# Altium integrated library Samtec 2 mm Pitch Terminal Strips.IntLib: 623 symbols (part 1 of 5) (continued)
## MMT-107-01-L-DH-K
designator P?
Horizontal Surface Mount Header, -55 to 125 degC, 2 mm Pitch, 14-Pin, Male, RoHS; Manufacturer: Samtec; PartNumber: MMT-107-01-L-DH-K; Pitch: 2 mm; DatasheetVersion: F-214; PackageVersion: CY, 12/2000; PackageReference: MMT-107-01-X-DH-K; PackageDescription: 2mm Horizontal Terminal Surface Mount Strip ASSEM; Orientation: Horizontal; RoHS: True; Temperature Range: -55 to 125 degC; Mounting Technology: Surface Mount; ComponentLink1Description: Manufacturer URL; ComponentLink1URL: http://www.samtec.com; ComponentLink2Description: Datasheet; ComponentLink2URL: http://d2a072wq521u33.cloudfront.net/catalog_english//MMT_SM.PDF; ComponentLink3Description: Package Specification; ComponentLink3URL: http://www.samtec.com/documents/webfiles/cpdf/MMT-1XX-XX-XX-XX-XX-XXX-X-XX-MKT.pdf
footprint SMTC-MMT-107-01-X-DH-K (Terminal Surface Mount Strip ASSEM, 2x7 Pins, Horizontal, 2mm Pitch, Male)
pins: 1, 2, 3, 4, 5, 6, 7, 8, 9, 10, 11, 12, 13, 14

## MMT-107-01-L-MT
designator P?
Header, Horizontal, -55 to 125 degC, 2 mm Pitch, 14-Pin, Male, RoHS; Manufacturer: Samtec; PartNumber: MMT-107-01-L-MT; Pitch: 2 mm; DatasheetVersion: F-214; PackageVersion: CY, 12/2000; PackageReference: MMT-107-01-X-MT; PackageDescription: 2mm Horizontal Terminal Surface Mount Strip ASSEM; Supplier 1: Newark; Supplier Part Number 1: 85T5699; Orientation: Horizontal; RoHS: True; Temperature Range: -55 to 125 degC; ComponentLink1Description: Manufacturer URL; ComponentLink1URL: http://www.samtec.com; ComponentLink2Description: Datasheet; ComponentLink2URL: http://d2a072wq521u33.cloudfront.net/catalog_english//MMT_SM.PDF; ComponentLink3Description: Package Specification; ComponentLink3URL: http://www.samtec.com/documents/webfiles/cpdf/MMT-1XX-XX-XX-XX-XX-XXX-X-XX-MKT.pdf
footprint SMTC-MMT-107-01-X-MT (Terminal Strip ASSEM, 2x7 Pins, Horizontal, 2mm Pitch, Male)
pins: 1, 2, 3, 4, 5, 6, 7, 8, 9, 10, 11, 12, 13, 14

## MMT-107-01-L-SH
designator P?
Horizontal Surface Mount Header, -55 to 125 degC, 2 mm Pitch, 7-Pin, Male, RoHS; Manufacturer: Samtec; PartNumber: MMT-107-01-L-SH; Pitch: 2 mm; DatasheetVersion: F-214; PackageVersion: CY, 12/2000; PackageReference: MMT-107-01-X-SH; PackageDescription: 2mm Horizontal Terminal Surface Mount Strip ASSEM; Supplier 1: Newark; Supplier Part Number 1: 85T5700; Orientation: Horizontal; RoHS: True; Temperature Range: -55 to 125 degC; Mounting Technology: Surface Mount; ComponentLink1Description: Manufacturer URL; ComponentLink1URL: http://www.samtec.com; ComponentLink2Description: Datasheet; ComponentLink2URL: http://d2a072wq521u33.cloudfront.net/catalog_english//MMT_SM.PDF; ComponentLink3Description: Package Specification; ComponentLink3URL: http://www.samtec.com/documents/webfiles/cpdf/MMT-1XX-XX-XX-XX-XX-XXX-X-XX-MKT.pdf
footprint SMTC-MMT-107-01-X-SH (Terminal Surface Mount Strip ASSEM, 1x7 Pins, Horizontal, 2mm Pitch, Male)
pins: 1, 2, 3, 4, 5, 6, 7

## MMT-107-01-T-DH-K
designator P?
Horizontal Surface Mount Header, -55 to 105 degC, 2 mm Pitch, 14-Pin, Male, RoHS; Manufacturer: Samtec; PartNumber: MMT-107-01-T-DH-K; Pitch: 2 mm; DatasheetVersion: F-214; PackageVersion: CY, 12/2000; PackageReference: MMT-107-01-X-DH-K; PackageDescription: 2mm Horizontal Terminal Surface Mount Strip ASSEM; Orientation: Horizontal; RoHS: True; Temperature Range: -55 to 105 degC; Mounting Technology: Surface Mount; ComponentLink1Description: Manufacturer URL; ComponentLink1URL: http://www.samtec.com; ComponentLink2Description: Datasheet; ComponentLink2URL: http://d2a072wq521u33.cloudfront.net/catalog_english//MMT_SM.PDF; ComponentLink3Description: Package Specification; ComponentLink3URL: http://www.samtec.com/documents/webfiles/cpdf/MMT-1XX-XX-XX-XX-XX-XXX-X-XX-MKT.pdf
footprint SMTC-MMT-107-01-X-DH-K (Terminal Surface Mount Strip ASSEM, 2x7 Pins, Horizontal, 2mm Pitch, Male)
pins: 1, 2, 3, 4, 5, 6, 7, 8, 9, 10, 11, 12, 13, 14

## MMT-107-01-T-MT
designator P?
Header, Horizontal, -55 to 105 degC, 2 mm Pitch, 14-Pin, Male, RoHS; Manufacturer: Samtec; PartNumber: MMT-107-01-T-MT; Pitch: 2 mm; DatasheetVersion: F-214; PackageVersion: CY, 12/2000; PackageReference: MMT-107-01-X-MT; PackageDescription: 2mm Horizontal Terminal Surface Mount Strip ASSEM; Supplier 1: Newark; Supplier Part Number 1: 85T5702; Orientation: Horizontal; RoHS: True; Temperature Range: -55 to 105 degC; ComponentLink1Description: Manufacturer URL; ComponentLink1URL: http://www.samtec.com; ComponentLink2Description: Datasheet; ComponentLink2URL: http://d2a072wq521u33.cloudfront.net/catalog_english//MMT_SM.PDF; ComponentLink3Description: Package Specification; ComponentLink3URL: http://www.samtec.com/documents/webfiles/cpdf/MMT-1XX-XX-XX-XX-XX-XXX-X-XX-MKT.pdf
footprint SMTC-MMT-107-01-X-MT (Terminal Strip ASSEM, 2x7 Pins, Horizontal, 2mm Pitch, Male)
pins: 1, 2, 3, 4, 5, 6, 7, 8, 9, 10, 11, 12, 13, 14

## MMT-107-01-T-SH
designator P?
Horizontal Surface Mount Header, -55 to 105 degC, 2 mm Pitch, 7-Pin, Male, RoHS; Manufacturer: Samtec; PartNumber: MMT-107-01-T-SH; Pitch: 2 mm; DatasheetVersion: F-214; PackageVersion: CY, 12/2000; PackageReference: MMT-107-01-X-SH; PackageDescription: 2mm Horizontal Terminal Surface Mount Strip ASSEM; Supplier 1: Newark; Supplier Part Number 1: 85T5703; Orientation: Horizontal; RoHS: True; Temperature Range: -55 to 105 degC; Mounting Technology: Surface Mount; ComponentLink1Description: Manufacturer URL; ComponentLink1URL: http://www.samtec.com; ComponentLink2Description: Datasheet; ComponentLink2URL: http://d2a072wq521u33.cloudfront.net/catalog_english//MMT_SM.PDF; ComponentLink3Description: Package Specification; ComponentLink3URL: http://www.samtec.com/documents/webfiles/cpdf/MMT-1XX-XX-XX-XX-XX-XXX-X-XX-MKT.pdf
footprint SMTC-MMT-107-01-X-SH (Terminal Surface Mount Strip ASSEM, 1x7 Pins, Horizontal, 2mm Pitch, Male)
pins: 1, 2, 3, 4, 5, 6, 7

## MMT-108-01-F-DV
designator P?
Surface Mount Header, Vertical, -55 to 125 degC, 2 mm Pitch, 16-Pin, Male, RoHS; Manufacturer: Samtec; PartNumber: MMT-108-01-F-DV; Pitch: 2 mm; DatasheetVersion: F-214; PackageVersion: U, 6/1992; PackageReference: MMT-108-01-X-DV; PackageDescription: 2 mm Terminal SV/DV; Orientation: Vertical; RoHS: True; Temperature Range: -55 to 125 degC; Mounting Technology: Surface Mount; ComponentLink1Description: Manufacturer URL; ComponentLink1URL: http://www.samtec.com; ComponentLink2Description: Datasheet; ComponentLink2URL: http://d2a072wq521u33.cloudfront.net/catalog_english//MMT_SM.PDF; ComponentLink3Description: Package Specification; ComponentLink3URL: http://www.samtec.com/documents/webfiles/cpdf/MMT-1XX-XX-X-XV-XX-XX-XX-MKT.pdf
footprint SMTC-MMT-108-01-X-DV (Terminal SV/DV, 2x8 Pins, Vertical, 2mm Pitch, Male)
pins: 1, 2, 3, 4, 5, 6, 7, 8, 9, 10, 11, 12, 13, 14, 15, 16

## MMT-108-01-F-MT
designator P?
Header, Horizontal, -55 to 125 degC, 2 mm Pitch, 16-Pin, Male, RoHS; Manufacturer: Samtec; PartNumber: MMT-108-01-F-MT; Pitch: 2 mm; DatasheetVersion: F-214; PackageVersion: CY, 12/2000; PackageReference: MMT-108-01-X-MT; PackageDescription: 2mm Horizontal Terminal Surface Mount Strip ASSEM; Orientation: Horizontal; RoHS: True; Temperature Range: -55 to 125 degC; ComponentLink1Description: Manufacturer URL; ComponentLink1URL: http://www.samtec.com; ComponentLink2Description: Datasheet; ComponentLink2URL: http://d2a072wq521u33.cloudfront.net/catalog_english//MMT_SM.PDF; ComponentLink3Description: Package Specification; ComponentLink3URL: http://www.samtec.com/documents/webfiles/cpdf/MMT-1XX-XX-XX-XX-XX-XXX-X-XX-MKT.pdf
footprint SMTC-MMT-108-01-X-MT (Terminal Strip ASSEM, 2x8 Pins, Horizontal, 2mm Pitch, Male)
pins: 1, 2, 3, 4, 5, 6, 7, 8, 9, 10, 11, 12, 13, 14, 15, 16

## MMT-108-01-L-DV
designator P?
Surface Mount Header, Vertical, -55 to 125 degC, 2 mm Pitch, 16-Pin, Male, RoHS; Manufacturer: Samtec; PartNumber: MMT-108-01-L-DV; Pitch: 2 mm; DatasheetVersion: F-214; PackageVersion: U, 6/1992; PackageReference: MMT-108-01-X-DV; PackageDescription: 2 mm Terminal SV/DV; Orientation: Vertical; RoHS: True; Temperature Range: -55 to 125 degC; Mounting Technology: Surface Mount; ComponentLink1Description: Manufacturer URL; ComponentLink1URL: http://www.samtec.com; ComponentLink2Description: Datasheet; ComponentLink2URL: http://d2a072wq521u33.cloudfront.net/catalog_english//MMT_SM.PDF; ComponentLink3Description: Package Specification; ComponentLink3URL: http://www.samtec.com/documents/webfiles/cpdf/MMT-1XX-XX-X-XV-XX-XX-XX-MKT.pdf
footprint SMTC-MMT-108-01-X-DV (Terminal SV/DV, 2x8 Pins, Vertical, 2mm Pitch, Male)
pins: 1, 2, 3, 4, 5, 6, 7, 8, 9, 10, 11, 12, 13, 14, 15, 16

## MMT-108-01-L-MT
designator P?
Header, Horizontal, -55 to 125 degC, 2 mm Pitch, 16-Pin, Male, RoHS; Manufacturer: Samtec; PartNumber: MMT-108-01-L-MT; Pitch: 2 mm; DatasheetVersion: F-214; PackageVersion: CY, 12/2000; PackageReference: MMT-108-01-X-MT; PackageDescription: 2mm Horizontal Terminal Surface Mount Strip ASSEM; Supplier 1: Newark; Supplier Part Number 1: 85T5711; Orientation: Horizontal; RoHS: True; Temperature Range: -55 to 125 degC; ComponentLink1Description: Manufacturer URL; ComponentLink1URL: http://www.samtec.com; ComponentLink2Description: Datasheet; ComponentLink2URL: http://d2a072wq521u33.cloudfront.net/catalog_english//MMT_SM.PDF; ComponentLink3Description: Package Specification; ComponentLink3URL: http://www.samtec.com/documents/webfiles/cpdf/MMT-1XX-XX-XX-XX-XX-XXX-X-XX-MKT.pdf
footprint SMTC-MMT-108-01-X-MT (Terminal Strip ASSEM, 2x8 Pins, Horizontal, 2mm Pitch, Male)
pins: 1, 2, 3, 4, 5, 6, 7, 8, 9, 10, 11, 12, 13, 14, 15, 16

## MMT-108-01-T-DV
designator P?
Surface Mount Header, Vertical, -55 to 105 degC, 2 mm Pitch, 16-Pin, Male, RoHS; Manufacturer: Samtec; PartNumber: MMT-108-01-T-DV; Pitch: 2 mm; DatasheetVersion: F-214; PackageVersion: U, 6/1992; PackageReference: MMT-108-01-X-DV; PackageDescription: 2 mm Terminal SV/DV; Orientation: Vertical; RoHS: True; Temperature Range: -55 to 105 degC; Mounting Technology: Surface Mount; ComponentLink1Description: Manufacturer URL; ComponentLink1URL: http://www.samtec.com; ComponentLink2Description: Datasheet; ComponentLink2URL: http://d2a072wq521u33.cloudfront.net/catalog_english//MMT_SM.PDF; ComponentLink3Description: Package Specification; ComponentLink3URL: http://www.samtec.com/documents/webfiles/cpdf/MMT-1XX-XX-X-XV-XX-XX-XX-MKT.pdf
footprint SMTC-MMT-108-01-X-DV (Terminal SV/DV, 2x8 Pins, Vertical, 2mm Pitch, Male)
pins: 1, 2, 3, 4, 5, 6, 7, 8, 9, 10, 11, 12, 13, 14, 15, 16

## MMT-108-01-T-MT
designator P?
Header, Horizontal, -55 to 105 degC, 2 mm Pitch, 16-Pin, Male, RoHS; Manufacturer: Samtec; PartNumber: MMT-108-01-T-MT; Pitch: 2 mm; DatasheetVersion: F-214; PackageVersion: CY, 12/2000; PackageReference: MMT-108-01-X-MT; PackageDescription: 2mm Horizontal Terminal Surface Mount Strip ASSEM; Supplier 1: Newark; Supplier Part Number 1: 85T5713; Orientation: Horizontal; RoHS: True; Temperature Range: -55 to 105 degC; ComponentLink1Description: Manufacturer URL; ComponentLink1URL: http://www.samtec.com; ComponentLink2Description: Datasheet; ComponentLink2URL: http://d2a072wq521u33.cloudfront.net/catalog_english//MMT_SM.PDF; ComponentLink3Description: Package Specification; ComponentLink3URL: http://www.samtec.com/documents/webfiles/cpdf/MMT-1XX-XX-XX-XX-XX-XXX-X-XX-MKT.pdf
footprint SMTC-MMT-108-01-X-MT (Terminal Strip ASSEM, 2x8 Pins, Horizontal, 2mm Pitch, Male)
pins: 1, 2, 3, 4, 5, 6, 7, 8, 9, 10, 11, 12, 13, 14, 15, 16

## MMT-108-02-F-SH-A-K
designator P?
Horizontal Surface Mount Header, -55 to 125 degC, 2 mm Pitch, 8-Pin, Male, RoHS; Manufacturer: Samtec; PartNumber: MMT-108-02-F-SH-A-K; Pitch: 2 mm; DatasheetVersion: F-214; PackageVersion: CY, 12/2000; PackageReference: MMT-108-02-X-SH-A-K; PackageDescription: 2mm Horizontal Terminal Surface Mount Strip ASSEM; Orientation: Horizontal; RoHS: True; Temperature Range: -55 to 125 degC; Mounting Technology: Surface Mount; ComponentLink1Description: Manufacturer URL; ComponentLink1URL: http://www.samtec.com; ComponentLink2Description: Datasheet; ComponentLink2URL: http://d2a072wq521u33.cloudfront.net/catalog_english//MMT_SM.PDF; ComponentLink3Description: Package Specification; ComponentLink3URL: http://www.samtec.com/documents/webfiles/cpdf/MMT-1XX-XX-XX-XX-XX-XXX-X-XX-MKT.pdf
footprint SMTC-MMT-108-02-X-SH-A-K (Terminal Surface Mount Strip ASSEM, 1x8 Pins, Horizontal, 2mm Pitch, Male)
pins: 1, 2, 3, 4, 5, 6, 7, 8

## MMT-108-02-L-SH-A-K
designator P?
Horizontal Surface Mount Header, -55 to 125 degC, 2 mm Pitch, 8-Pin, Male, RoHS; Manufacturer: Samtec; PartNumber: MMT-108-02-L-SH-A-K; Pitch: 2 mm; DatasheetVersion: F-214; PackageVersion: CY, 12/2000; PackageReference: MMT-108-02-X-SH-A-K; PackageDescription: 2mm Horizontal Terminal Surface Mount Strip ASSEM; Orientation: Horizontal; RoHS: True; Temperature Range: -55 to 125 degC; Mounting Technology: Surface Mount; ComponentLink1Description: Manufacturer URL; ComponentLink1URL: http://www.samtec.com; ComponentLink2Description: Datasheet; ComponentLink2URL: http://d2a072wq521u33.cloudfront.net/catalog_english//MMT_SM.PDF; ComponentLink3Description: Package Specification; ComponentLink3URL: http://www.samtec.com/documents/webfiles/cpdf/MMT-1XX-XX-XX-XX-XX-XXX-X-XX-MKT.pdf
footprint SMTC-MMT-108-02-X-SH-A-K (Terminal Surface Mount Strip ASSEM, 1x8 Pins, Horizontal, 2mm Pitch, Male)
pins: 1, 2, 3, 4, 5, 6, 7, 8

## MMT-108-02-T-SH-A-K
designator P?
Horizontal Surface Mount Header, -55 to 105 degC, 2 mm Pitch, 8-Pin, Male, RoHS; Manufacturer: Samtec; PartNumber: MMT-108-02-T-SH-A-K; Pitch: 2 mm; DatasheetVersion: F-214; PackageVersion: CY, 12/2000; PackageReference: MMT-108-02-X-SH-A-K; PackageDescription: 2mm Horizontal Terminal Surface Mount Strip ASSEM; Orientation: Horizontal; RoHS: True; Temperature Range: -55 to 105 degC; Mounting Technology: Surface Mount; ComponentLink1Description: Manufacturer URL; ComponentLink1URL: http://www.samtec.com; ComponentLink2Description: Datasheet; ComponentLink2URL: http://d2a072wq521u33.cloudfront.net/catalog_english//MMT_SM.PDF; ComponentLink3Description: Package Specification; ComponentLink3URL: http://www.samtec.com/documents/webfiles/cpdf/MMT-1XX-XX-XX-XX-XX-XXX-X-XX-MKT.pdf
footprint SMTC-MMT-108-02-X-SH-A-K (Terminal Surface Mount Strip ASSEM, 1x8 Pins, Horizontal, 2mm Pitch, Male)
pins: 1, 2, 3, 4, 5, 6, 7, 8

## MMT-109-01-F-DH-K-BASIC
designator P?
Horizontal Surface Mount Header, -55 to 125 degC, 2 mm Pitch, 18-Pin, Male, RoHS; Manufacturer: Samtec; PartNumber: MMT-109-01-F-DH-K-BASIC; Pitch: 2 mm; DatasheetVersion: F-214; PackageVersion: CY, 12/2000; PackageReference: MMT-109-01-X-DH-K-BASIC; PackageDescription: 2mm Horizontal Terminal Surface Mount Strip ASSEM; Orientation: Horizontal; RoHS: True; Temperature Range: -55 to 125 degC; Mounting Technology: Surface Mount; ComponentLink1Description: Manufacturer URL; ComponentLink1URL: http://www.samtec.com; ComponentLink2Description: Datasheet; ComponentLink2URL: http://d2a072wq521u33.cloudfront.net/catalog_english//MMT_SM.PDF; ComponentLink3Description: Package Specification; ComponentLink3URL: http://www.samtec.com/documents/webfiles/cpdf/MMT-1XX-XX-XX-XX-XX-XXX-X-XX-MKT.pdf
footprint SMTC-MMT-109-01-X-DH-K-BASIC (Terminal Surface Mount Strip ASSEM, 2x9 Pins, Horizontal, 2mm Pitch, Male)
pins: 1, 2, 3, 4, 5, 6, 7, 8, 9, 10, 11, 12, 13, 14, 15, 16, 17, 18

## MMT-109-01-F-MT
designator P?
Header, Horizontal, -55 to 125 degC, 2 mm Pitch, 18-Pin, Male, RoHS; Manufacturer: Samtec; PartNumber: MMT-109-01-F-MT; Pitch: 2 mm; DatasheetVersion: F-214; PackageVersion: CY, 12/2000; PackageReference: MMT-109-01-X-MT; PackageDescription: 2mm Horizontal Terminal Surface Mount Strip ASSEM; Orientation: Horizontal; RoHS: True; Temperature Range: -55 to 125 degC; ComponentLink1Description: Manufacturer URL; ComponentLink1URL: http://www.samtec.com; ComponentLink2Description: Datasheet; ComponentLink2URL: http://d2a072wq521u33.cloudfront.net/catalog_english//MMT_SM.PDF; ComponentLink3Description: Package Specification; ComponentLink3URL: http://www.samtec.com/documents/webfiles/cpdf/MMT-1XX-XX-XX-XX-XX-XXX-X-XX-MKT.pdf
footprint SMTC-MMT-109-01-X-MT (Terminal Strip ASSEM, 2x9 Pins, Horizontal, 2mm Pitch, Male)
pins: 1, 2, 3, 4, 5, 6, 7, 8, 9, 10, 11, 12, 13, 14, 15, 16, 17, 18

## MMT-109-01-L-DH-K-BASIC
designator P?
Horizontal Surface Mount Header, -55 to 125 degC, 2 mm Pitch, 18-Pin, Male, RoHS; Manufacturer: Samtec; PartNumber: MMT-109-01-L-DH-K-BASIC; Pitch: 2 mm; DatasheetVersion: F-214; PackageVersion: CY, 12/2000; PackageReference: MMT-109-01-X-DH-K-BASIC; PackageDescription: 2mm Horizontal Terminal Surface Mount Strip ASSEM; Orientation: Horizontal; RoHS: True; Temperature Range: -55 to 125 degC; Mounting Technology: Surface Mount; ComponentLink1Description: Manufacturer URL; ComponentLink1URL: http://www.samtec.com; ComponentLink2Description: Datasheet; ComponentLink2URL: http://d2a072wq521u33.cloudfront.net/catalog_english//MMT_SM.PDF; ComponentLink3Description: Package Specification; ComponentLink3URL: http://www.samtec.com/documents/webfiles/cpdf/MMT-1XX-XX-XX-XX-XX-XXX-X-XX-MKT.pdf
footprint SMTC-MMT-109-01-X-DH-K-BASIC (Terminal Surface Mount Strip ASSEM, 2x9 Pins, Horizontal, 2mm Pitch, Male)
pins: 1, 2, 3, 4, 5, 6, 7, 8, 9, 10, 11, 12, 13, 14, 15, 16, 17, 18

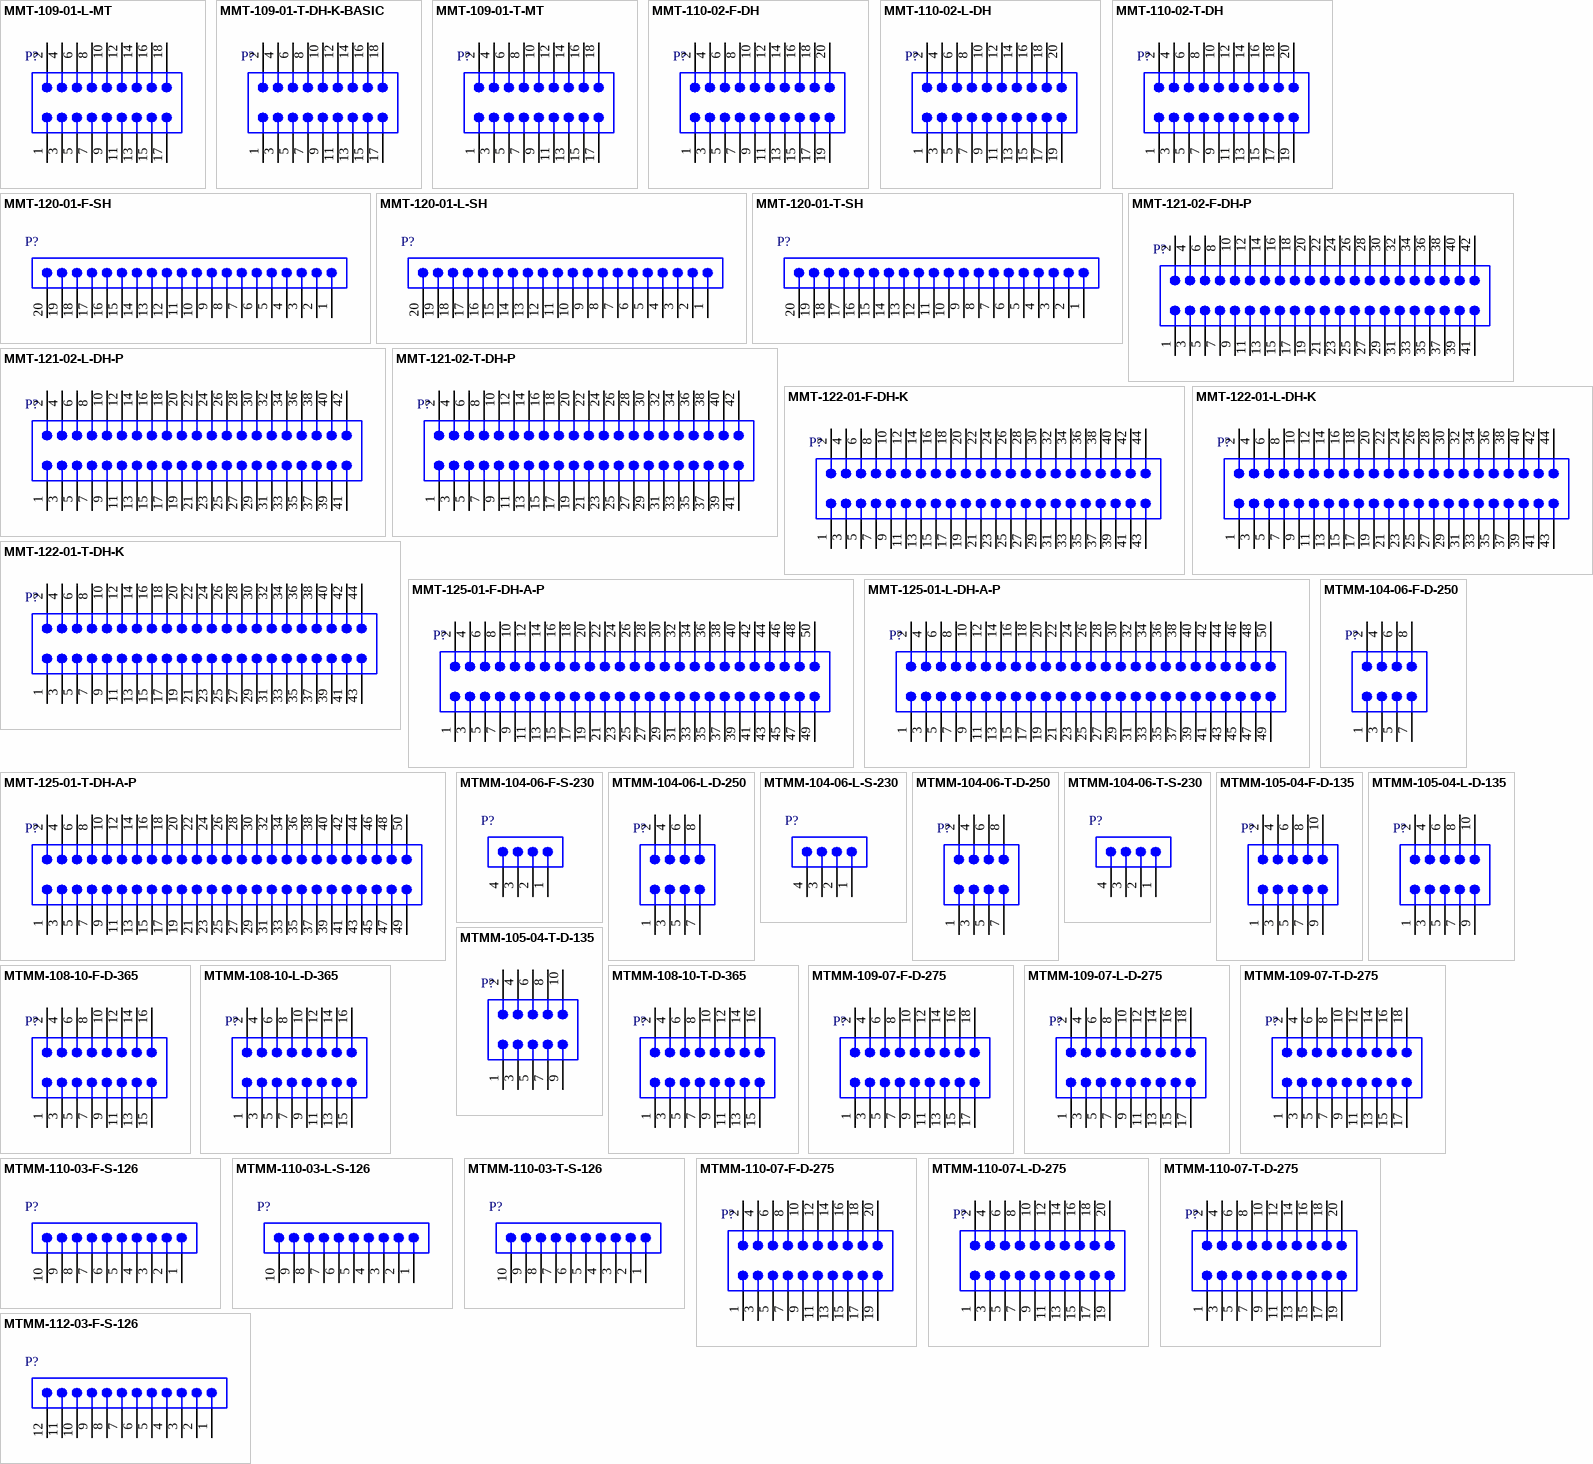
[diagram p3: symbols MMT-109-01-L-MT to MTMM-112-03-F-S-126]

## MMT-109-01-L-MT
designator P?
Header, Horizontal, -55 to 125 degC, 2 mm Pitch, 18-Pin, Male, RoHS; Manufacturer: Samtec; PartNumber: MMT-109-01-L-MT; Pitch: 2 mm; DatasheetVersion: F-214; PackageVersion: CY, 12/2000; PackageReference: MMT-109-01-X-MT; PackageDescription: 2mm Horizontal Terminal Surface Mount Strip ASSEM; Supplier 1: Newark; Supplier Part Number 1: 85T5722; Orientation: Horizontal; RoHS: True; Temperature Range: -55 to 125 degC; ComponentLink1Description: Manufacturer URL; ComponentLink1URL: http://www.samtec.com; ComponentLink2Description: Datasheet; ComponentLink2URL: http://d2a072wq521u33.cloudfront.net/catalog_english//MMT_SM.PDF; ComponentLink3Description: Package Specification; ComponentLink3URL: http://www.samtec.com/documents/webfiles/cpdf/MMT-1XX-XX-XX-XX-XX-XXX-X-XX-MKT.pdf
footprint SMTC-MMT-109-01-X-MT (Terminal Strip ASSEM, 2x9 Pins, Horizontal, 2mm Pitch, Male)
pins: 1, 2, 3, 4, 5, 6, 7, 8, 9, 10, 11, 12, 13, 14, 15, 16, 17, 18

## MMT-109-01-T-DH-K-BASIC
designator P?
Horizontal Surface Mount Header, -55 to 105 degC, 2 mm Pitch, 18-Pin, Male, RoHS; Manufacturer: Samtec; PartNumber: MMT-109-01-T-DH-K-BASIC; Pitch: 2 mm; DatasheetVersion: F-214; PackageVersion: CY, 12/2000; PackageReference: MMT-109-01-X-DH-K-BASIC; PackageDescription: 2mm Horizontal Terminal Surface Mount Strip ASSEM; Orientation: Horizontal; RoHS: True; Temperature Range: -55 to 105 degC; Mounting Technology: Surface Mount; ComponentLink1Description: Manufacturer URL; ComponentLink1URL: http://www.samtec.com; ComponentLink2Description: Datasheet; ComponentLink2URL: http://d2a072wq521u33.cloudfront.net/catalog_english//MMT_SM.PDF; ComponentLink3Description: Package Specification; ComponentLink3URL: http://www.samtec.com/documents/webfiles/cpdf/MMT-1XX-XX-XX-XX-XX-XXX-X-XX-MKT.pdf
footprint SMTC-MMT-109-01-X-DH-K-BASIC (Terminal Surface Mount Strip ASSEM, 2x9 Pins, Horizontal, 2mm Pitch, Male)
pins: 1, 2, 3, 4, 5, 6, 7, 8, 9, 10, 11, 12, 13, 14, 15, 16, 17, 18

## MMT-109-01-T-MT
designator P?
Header, Horizontal, -55 to 105 degC, 2 mm Pitch, 18-Pin, Male, RoHS; Manufacturer: Samtec; PartNumber: MMT-109-01-T-MT; Pitch: 2 mm; DatasheetVersion: F-214; PackageVersion: CY, 12/2000; PackageReference: MMT-109-01-X-MT; PackageDescription: 2mm Horizontal Terminal Surface Mount Strip ASSEM; Supplier 1: Newark; Supplier Part Number 1: 85T5725; Orientation: Horizontal; RoHS: True; Temperature Range: -55 to 105 degC; ComponentLink1Description: Manufacturer URL; ComponentLink1URL: http://www.samtec.com; ComponentLink2Description: Datasheet; ComponentLink2URL: http://d2a072wq521u33.cloudfront.net/catalog_english//MMT_SM.PDF; ComponentLink3Description: Package Specification; ComponentLink3URL: http://www.samtec.com/documents/webfiles/cpdf/MMT-1XX-XX-XX-XX-XX-XXX-X-XX-MKT.pdf
footprint SMTC-MMT-109-01-X-MT (Terminal Strip ASSEM, 2x9 Pins, Horizontal, 2mm Pitch, Male)
pins: 1, 2, 3, 4, 5, 6, 7, 8, 9, 10, 11, 12, 13, 14, 15, 16, 17, 18

## MMT-110-02-F-DH
designator P?
Horizontal Surface Mount Header, -55 to 125 degC, 2 mm Pitch, 20-Pin, Male, RoHS; Manufacturer: Samtec; PartNumber: MMT-110-02-F-DH; Pitch: 2 mm; DatasheetVersion: F-214; PackageVersion: CY, 12/2000; PackageReference: MMT-110-02-X-DH; PackageDescription: 2mm Horizontal Terminal Surface Mount Strip ASSEM; Orientation: Horizontal; RoHS: True; Temperature Range: -55 to 125 degC; Mounting Technology: Surface Mount; ComponentLink1Description: Manufacturer URL; ComponentLink1URL: http://www.samtec.com; ComponentLink2Description: Datasheet; ComponentLink2URL: http://d2a072wq521u33.cloudfront.net/catalog_english//MMT_SM.PDF; ComponentLink3Description: Package Specification; ComponentLink3URL: http://www.samtec.com/documents/webfiles/cpdf/MMT-1XX-XX-XX-XX-XX-XXX-X-XX-MKT.pdf
footprint SMTC-MMT-110-02-X-DH (Terminal Surface Mount Strip ASSEM, 2x10 Pins, Horizontal, 2mm Pitch, Male)
pins: 1, 2, 3, 4, 5, 6, 7, 8, 9, 10, 11, 12, 13, 14, 15, 16, 17, 18, 19, 20

## MMT-110-02-L-DH
designator P?
Horizontal Surface Mount Header, -55 to 125 degC, 2 mm Pitch, 20-Pin, Male, RoHS; Manufacturer: Samtec; PartNumber: MMT-110-02-L-DH; Pitch: 2 mm; DatasheetVersion: F-214; PackageVersion: CY, 12/2000; PackageReference: MMT-110-02-X-DH; PackageDescription: 2mm Horizontal Terminal Surface Mount Strip ASSEM; Supplier 1: Newark; Supplier Part Number 1: 85T5740; Orientation: Horizontal; RoHS: True; Temperature Range: -55 to 125 degC; Mounting Technology: Surface Mount; ComponentLink1Description: Manufacturer URL; ComponentLink1URL: http://www.samtec.com; ComponentLink2Description: Datasheet; ComponentLink2URL: http://d2a072wq521u33.cloudfront.net/catalog_english//MMT_SM.PDF; ComponentLink3Description: Package Specification; ComponentLink3URL: http://www.samtec.com/documents/webfiles/cpdf/MMT-1XX-XX-XX-XX-XX-XXX-X-XX-MKT.pdf
footprint SMTC-MMT-110-02-X-DH (Terminal Surface Mount Strip ASSEM, 2x10 Pins, Horizontal, 2mm Pitch, Male)
pins: 1, 2, 3, 4, 5, 6, 7, 8, 9, 10, 11, 12, 13, 14, 15, 16, 17, 18, 19, 20

## MMT-110-02-T-DH
designator P?
Horizontal Surface Mount Header, -55 to 105 degC, 2 mm Pitch, 20-Pin, Male, RoHS; Manufacturer: Samtec; PartNumber: MMT-110-02-T-DH; Pitch: 2 mm; DatasheetVersion: F-214; PackageVersion: CY, 12/2000; PackageReference: MMT-110-02-X-DH; PackageDescription: 2mm Horizontal Terminal Surface Mount Strip ASSEM; Supplier 1: Newark; Supplier Part Number 1: 85T5743; Orientation: Horizontal; RoHS: True; Temperature Range: -55 to 105 degC; Mounting Technology: Surface Mount; ComponentLink1Description: Manufacturer URL; ComponentLink1URL: http://www.samtec.com; ComponentLink2Description: Datasheet; ComponentLink2URL: http://d2a072wq521u33.cloudfront.net/catalog_english//MMT_SM.PDF; ComponentLink3Description: Package Specification; ComponentLink3URL: http://www.samtec.com/documents/webfiles/cpdf/MMT-1XX-XX-XX-XX-XX-XXX-X-XX-MKT.pdf
footprint SMTC-MMT-110-02-X-DH (Terminal Surface Mount Strip ASSEM, 2x10 Pins, Horizontal, 2mm Pitch, Male)
pins: 1, 2, 3, 4, 5, 6, 7, 8, 9, 10, 11, 12, 13, 14, 15, 16, 17, 18, 19, 20

## MMT-120-01-F-SH
designator P?
Horizontal Surface Mount Header, -55 to 125 degC, 2 mm Pitch, 20-Pin, Male, RoHS; Manufacturer: Samtec; PartNumber: MMT-120-01-F-SH; Pitch: 2 mm; DatasheetVersion: F-214; PackageVersion: CY, 12/2000; PackageReference: MMT-120-01-X-SH; PackageDescription: 2mm Horizontal Terminal Surface Mount Strip ASSEM; Orientation: Horizontal; RoHS: True; Temperature Range: -55 to 125 degC; Mounting Technology: Surface Mount; ComponentLink1Description: Manufacturer URL; ComponentLink1URL: http://www.samtec.com; ComponentLink2Description: Datasheet; ComponentLink2URL: http://d2a072wq521u33.cloudfront.net/catalog_english//MMT_SM.PDF; ComponentLink3Description: Package Specification; ComponentLink3URL: http://www.samtec.com/documents/webfiles/cpdf/MMT-1XX-XX-XX-XX-XX-XXX-X-XX-MKT.pdf
footprint SMTC-MMT-120-01-X-SH (Terminal Surface Mount Strip ASSEM, 1x20 Pins, Horizontal, 2mm Pitch, Male)
pins: 1, 2, 3, 4, 5, 6, 7, 8, 9, 10, 11, 12, 13, 14, 15, 16, 17, 18, 19, 20

## MMT-120-01-L-SH
designator P?
Horizontal Surface Mount Header, -55 to 125 degC, 2 mm Pitch, 20-Pin, Male, RoHS; Manufacturer: Samtec; PartNumber: MMT-120-01-L-SH; Pitch: 2 mm; DatasheetVersion: F-214; PackageVersion: CY, 12/2000; PackageReference: MMT-120-01-X-SH; PackageDescription: 2mm Horizontal Terminal Surface Mount Strip ASSEM; Supplier 1: Newark; Supplier Part Number 1: 85T5831; Orientation: Horizontal; RoHS: True; Temperature Range: -55 to 125 degC; Mounting Technology: Surface Mount; ComponentLink1Description: Manufacturer URL; ComponentLink1URL: http://www.samtec.com; ComponentLink2Description: Datasheet; ComponentLink2URL: http://d2a072wq521u33.cloudfront.net/catalog_english//MMT_SM.PDF; ComponentLink3Description: Package Specification; ComponentLink3URL: http://www.samtec.com/documents/webfiles/cpdf/MMT-1XX-XX-XX-XX-XX-XXX-X-XX-MKT.pdf
footprint SMTC-MMT-120-01-X-SH (Terminal Surface Mount Strip ASSEM, 1x20 Pins, Horizontal, 2mm Pitch, Male)
pins: 1, 2, 3, 4, 5, 6, 7, 8, 9, 10, 11, 12, 13, 14, 15, 16, 17, 18, 19, 20

## MMT-120-01-T-SH
designator P?
Horizontal Surface Mount Header, -55 to 105 degC, 2 mm Pitch, 20-Pin, Male, RoHS; Manufacturer: Samtec; PartNumber: MMT-120-01-T-SH; Pitch: 2 mm; DatasheetVersion: F-214; PackageVersion: CY, 12/2000; PackageReference: MMT-120-01-X-SH; PackageDescription: 2mm Horizontal Terminal Surface Mount Strip ASSEM; Supplier 1: Newark; Supplier Part Number 1: 85T5834; Orientation: Horizontal; RoHS: True; Temperature Range: -55 to 105 degC; Mounting Technology: Surface Mount; ComponentLink1Description: Manufacturer URL; ComponentLink1URL: http://www.samtec.com; ComponentLink2Description: Datasheet; ComponentLink2URL: http://d2a072wq521u33.cloudfront.net/catalog_english//MMT_SM.PDF; ComponentLink3Description: Package Specification; ComponentLink3URL: http://www.samtec.com/documents/webfiles/cpdf/MMT-1XX-XX-XX-XX-XX-XXX-X-XX-MKT.pdf
footprint SMTC-MMT-120-01-X-SH (Terminal Surface Mount Strip ASSEM, 1x20 Pins, Horizontal, 2mm Pitch, Male)
pins: 1, 2, 3, 4, 5, 6, 7, 8, 9, 10, 11, 12, 13, 14, 15, 16, 17, 18, 19, 20

## MMT-121-02-F-DH-P
designator P?
Horizontal Surface Mount Header, -55 to 125 degC, 2 mm Pitch, 42-Pin, Male, RoHS; Manufacturer: Samtec; PartNumber: MMT-121-02-F-DH-P; Pitch: 2 mm; DatasheetVersion: F-214; PackageVersion: CY, 12/2000; PackageReference: MMT-121-02-X-DH-P; PackageDescription: 2mm Horizontal Terminal Surface Mount Strip ASSEM; Orientation: Horizontal; RoHS: True; Temperature Range: -55 to 125 degC; Mounting Technology: Surface Mount; ComponentLink1Description: Manufacturer URL; ComponentLink1URL: http://www.samtec.com; ComponentLink2Description: Datasheet; ComponentLink2URL: http://d2a072wq521u33.cloudfront.net/catalog_english//MMT_SM.PDF; ComponentLink3Description: Package Specification; ComponentLink3URL: http://www.samtec.com/documents/webfiles/cpdf/MMT-1XX-XX-XX-XX-XX-XXX-X-XX-MKT.pdf
footprint SMTC-MMT-121-02-X-DH-P (Terminal Surface Mount Strip ASSEM, 2x21 Pins, Horizontal, 2mm Pitch, Male)
pins: 1, 2, 3, 4, 5, 6, 7, 8, 9, 10, 11, 12, 13, 14, 15, 16, 17, 18, 19, 20, 21, 22, 23, 24, 25, 26, 27, 28, 29, 30, 31, 32, 33, 34, 35, 36, 37, 38, 39, 40, 41, 42

## MMT-121-02-L-DH-P
designator P?
Horizontal Surface Mount Header, -55 to 125 degC, 2 mm Pitch, 42-Pin, Male, RoHS; Manufacturer: Samtec; PartNumber: MMT-121-02-L-DH-P; Pitch: 2 mm; DatasheetVersion: F-214; PackageVersion: CY, 12/2000; PackageReference: MMT-121-02-X-DH-P; PackageDescription: 2mm Horizontal Terminal Surface Mount Strip ASSEM; Orientation: Horizontal; RoHS: True; Temperature Range: -55 to 125 degC; Mounting Technology: Surface Mount; ComponentLink1Description: Manufacturer URL; ComponentLink1URL: http://www.samtec.com; ComponentLink2Description: Datasheet; ComponentLink2URL: http://d2a072wq521u33.cloudfront.net/catalog_english//MMT_SM.PDF; ComponentLink3Description: Package Specification; ComponentLink3URL: http://www.samtec.com/documents/webfiles/cpdf/MMT-1XX-XX-XX-XX-XX-XXX-X-XX-MKT.pdf
footprint SMTC-MMT-121-02-X-DH-P (Terminal Surface Mount Strip ASSEM, 2x21 Pins, Horizontal, 2mm Pitch, Male)
pins: 1, 2, 3, 4, 5, 6, 7, 8, 9, 10, 11, 12, 13, 14, 15, 16, 17, 18, 19, 20, 21, 22, 23, 24, 25, 26, 27, 28, 29, 30, 31, 32, 33, 34, 35, 36, 37, 38, 39, 40, 41, 42

## MMT-121-02-T-DH-P
designator P?
Horizontal Surface Mount Header, -55 to 105 degC, 2 mm Pitch, 42-Pin, Male, RoHS; Manufacturer: Samtec; PartNumber: MMT-121-02-T-DH-P; Pitch: 2 mm; DatasheetVersion: F-214; PackageVersion: CY, 12/2000; PackageReference: MMT-121-02-X-DH-P; PackageDescription: 2mm Horizontal Terminal Surface Mount Strip ASSEM; Orientation: Horizontal; RoHS: True; Temperature Range: -55 to 105 degC; Mounting Technology: Surface Mount; ComponentLink1Description: Manufacturer URL; ComponentLink1URL: http://www.samtec.com; ComponentLink2Description: Datasheet; ComponentLink2URL: http://d2a072wq521u33.cloudfront.net/catalog_english//MMT_SM.PDF; ComponentLink3Description: Package Specification; ComponentLink3URL: http://www.samtec.com/documents/webfiles/cpdf/MMT-1XX-XX-XX-XX-XX-XXX-X-XX-MKT.pdf
footprint SMTC-MMT-121-02-X-DH-P (Terminal Surface Mount Strip ASSEM, 2x21 Pins, Horizontal, 2mm Pitch, Male)
pins: 1, 2, 3, 4, 5, 6, 7, 8, 9, 10, 11, 12, 13, 14, 15, 16, 17, 18, 19, 20, 21, 22, 23, 24, 25, 26, 27, 28, 29, 30, 31, 32, 33, 34, 35, 36, 37, 38, 39, 40, 41, 42

## MMT-122-01-F-DH-K
designator P?
Horizontal Surface Mount Header, -55 to 125 degC, 2 mm Pitch, 44-Pin, Male, RoHS; Manufacturer: Samtec; PartNumber: MMT-122-01-F-DH-K; Pitch: 2 mm; DatasheetVersion: F-214; PackageVersion: CY, 12/2000; PackageReference: MMT-122-01-X-DH-K; PackageDescription: 2mm Horizontal Terminal Surface Mount Strip ASSEM; Orientation: Horizontal; RoHS: True; Temperature Range: -55 to 125 degC; Mounting Technology: Surface Mount; ComponentLink1Description: Manufacturer URL; ComponentLink1URL: http://www.samtec.com; ComponentLink2Description: Datasheet; ComponentLink2URL: http://d2a072wq521u33.cloudfront.net/catalog_english//MMT_SM.PDF; ComponentLink3Description: Package Specification; ComponentLink3URL: http://www.samtec.com/documents/webfiles/cpdf/MMT-1XX-XX-XX-XX-XX-XXX-X-XX-MKT.pdf
footprint SMTC-MMT-122-01-X-DH-K (Terminal Surface Mount Strip ASSEM, 2x22 Pins, Horizontal, 2mm Pitch, Male)
pins: 1, 2, 3, 4, 5, 6, 7, 8, 9, 10, 11, 12, 13, 14, 15, 16, 17, 18, 19, 20, 21, 22, 23, 24, 25, 26, 27, 28, 29, 30, 31, 32, 33, 34, 35, 36, 37, 38, 39, 40, 41, 42, 43, 44

## MMT-122-01-L-DH-K
designator P?
Horizontal Surface Mount Header, -55 to 125 degC, 2 mm Pitch, 44-Pin, Male, RoHS; Manufacturer: Samtec; PartNumber: MMT-122-01-L-DH-K; Pitch: 2 mm; DatasheetVersion: F-214; PackageVersion: CY, 12/2000; PackageReference: MMT-122-01-X-DH-K; PackageDescription: 2mm Horizontal Terminal Surface Mount Strip ASSEM; Orientation: Horizontal; RoHS: True; Temperature Range: -55 to 125 degC; Mounting Technology: Surface Mount; ComponentLink1Description: Manufacturer URL; ComponentLink1URL: http://www.samtec.com; ComponentLink2Description: Datasheet; ComponentLink2URL: http://d2a072wq521u33.cloudfront.net/catalog_english//MMT_SM.PDF; ComponentLink3Description: Package Specification; ComponentLink3URL: http://www.samtec.com/documents/webfiles/cpdf/MMT-1XX-XX-XX-XX-XX-XXX-X-XX-MKT.pdf
footprint SMTC-MMT-122-01-X-DH-K (Terminal Surface Mount Strip ASSEM, 2x22 Pins, Horizontal, 2mm Pitch, Male)
pins: 1, 2, 3, 4, 5, 6, 7, 8, 9, 10, 11, 12, 13, 14, 15, 16, 17, 18, 19, 20, 21, 22, 23, 24, 25, 26, 27, 28, 29, 30, 31, 32, 33, 34, 35, 36, 37, 38, 39, 40, 41, 42, 43, 44

## MMT-122-01-T-DH-K
designator P?
Horizontal Surface Mount Header, -55 to 105 degC, 2 mm Pitch, 44-Pin, Male, RoHS; Manufacturer: Samtec; PartNumber: MMT-122-01-T-DH-K; Pitch: 2 mm; DatasheetVersion: F-214; PackageVersion: CY, 12/2000; PackageReference: MMT-122-01-X-DH-K; PackageDescription: 2mm Horizontal Terminal Surface Mount Strip ASSEM; Orientation: Horizontal; RoHS: True; Temperature Range: -55 to 105 degC; Mounting Technology: Surface Mount; ComponentLink1Description: Manufacturer URL; ComponentLink1URL: http://www.samtec.com; ComponentLink2Description: Datasheet; ComponentLink2URL: http://d2a072wq521u33.cloudfront.net/catalog_english//MMT_SM.PDF; ComponentLink3Description: Package Specification; ComponentLink3URL: http://www.samtec.com/documents/webfiles/cpdf/MMT-1XX-XX-XX-XX-XX-XXX-X-XX-MKT.pdf
footprint SMTC-MMT-122-01-X-DH-K (Terminal Surface Mount Strip ASSEM, 2x22 Pins, Horizontal, 2mm Pitch, Male)
pins: 1, 2, 3, 4, 5, 6, 7, 8, 9, 10, 11, 12, 13, 14, 15, 16, 17, 18, 19, 20, 21, 22, 23, 24, 25, 26, 27, 28, 29, 30, 31, 32, 33, 34, 35, 36, 37, 38, 39, 40, 41, 42, 43, 44

## MMT-125-01-F-DH-A-P
designator P?
Horizontal Surface Mount Header, -55 to 125 degC, 2 mm Pitch, 50-Pin, Male, RoHS; Manufacturer: Samtec; PartNumber: MMT-125-01-F-DH-A-P; Pitch: 2 mm; DatasheetVersion: F-214; PackageVersion: CY, 12/2000; PackageReference: MMT-125-01-X-DH-A-P; PackageDescription: 2mm Horizontal Terminal Surface Mount Strip ASSEM; Orientation: Horizontal; RoHS: True; Temperature Range: -55 to 125 degC; Mounting Technology: Surface Mount; ComponentLink1Description: Manufacturer URL; ComponentLink1URL: http://www.samtec.com; ComponentLink2Description: Datasheet; ComponentLink2URL: http://d2a072wq521u33.cloudfront.net/catalog_english//MMT_SM.PDF; ComponentLink3Description: Package Specification; ComponentLink3URL: http://www.samtec.com/documents/webfiles/cpdf/MMT-1XX-XX-XX-XX-XX-XXX-X-XX-MKT.pdf
footprint SMTC-MMT-125-01-X-DH-A-P (Terminal Surface Mount Strip ASSEM, 2x25 Pins, Horizontal, 2mm Pitch, Male)
pins: 1, 2, 3, 4, 5, 6, 7, 8, 9, 10, 11, 12, 13, 14, 15, 16, 17, 18, 19, 20, 21, 22, 23, 24, 25, 26, 27, 28, 29, 30, 31, 32, 33, 34, 35, 36, 37, 38, 39, 40, 41, 42, 43, 44, 45, 46, 47, 48, 49, 50

## MMT-125-01-L-DH-A-P
designator P?
Horizontal Surface Mount Header, -55 to 125 degC, 2 mm Pitch, 50-Pin, Male, RoHS; Manufacturer: Samtec; PartNumber: MMT-125-01-L-DH-A-P; Pitch: 2 mm; DatasheetVersion: F-214; PackageVersion: CY, 12/2000; PackageReference: MMT-125-01-X-DH-A-P; PackageDescription: 2mm Horizontal Terminal Surface Mount Strip ASSEM; Orientation: Horizontal; RoHS: True; Temperature Range: -55 to 125 degC; Mounting Technology: Surface Mount; ComponentLink1Description: Manufacturer URL; ComponentLink1URL: http://www.samtec.com; ComponentLink2Description: Datasheet; ComponentLink2URL: http://d2a072wq521u33.cloudfront.net/catalog_english//MMT_SM.PDF; ComponentLink3Description: Package Specification; ComponentLink3URL: http://www.samtec.com/documents/webfiles/cpdf/MMT-1XX-XX-XX-XX-XX-XXX-X-XX-MKT.pdf
footprint SMTC-MMT-125-01-X-DH-A-P (Terminal Surface Mount Strip ASSEM, 2x25 Pins, Horizontal, 2mm Pitch, Male)
pins: 1, 2, 3, 4, 5, 6, 7, 8, 9, 10, 11, 12, 13, 14, 15, 16, 17, 18, 19, 20, 21, 22, 23, 24, 25, 26, 27, 28, 29, 30, 31, 32, 33, 34, 35, 36, 37, 38, 39, 40, 41, 42, 43, 44, 45, 46, 47, 48, 49, 50